# Altium schematic symbol library AA_Symbols.SchLib: 1017 symbols (part 1 of 7) (continued)
## Cap_Ceramic_10u_50V_1210_10%
designator C?, comment DIELECTRIC: X7S  Voltage: 50V  (hidden comment: 10uF)
Capacitor, Ceramic, X7S, 10 uF, 50V, 1210, 10%; Manufacturer: Murata Electronics; Manufacturer P/N: GCM32EC71H106KA03K; Outset P/N: PN-0008382; Tolerance: 10%; Value: 10uF
footprint CC_3225_1210_N (Chip Capacitor, 2-Leads, Body 3.2x2.5mm, IPC Medium Density)
pins: 1, 2

## Cap_Ceramic_10u_50V_1210_10%_1
designator C?, comment DIELECTRIC: X7S  Voltage: 50V  (hidden comment: 10uF)
Capacitor, Ceramic, X7S, 10 uF, 50V, 1210, 10%; Manufacturer: Murata Electronics; Manufacturer P/N: GCM32EC71H106KA03K; Tolerance: 10%; Value: 10uF
footprint CC_3225_1210_N (Chip Capacitor, 2-Leads, Body 3.2x2.5mm, IPC Medium Density)
pins: 1, 2

## Cap_Ceramic_10u_50V_X7R_2220_20%
designator C?, comment DIELECTRIC: X7R  Voltage: 50V  (hidden comment: 10u)
Capacitor, Ceramic, 10u, 50V, X7R, 2220, 20%; Manufacturer: TDK Corporation; Manufacturer P/N: C5750X7R1H106M230KB; Outset P/N: PN-0003774; Supplier 1: Newark; Supplier Part Number 1: 87R4684; Value: 10u
footprint CC_5650_2220_N (Chip Capacitor, 2-Leads, Body 5.6x5.0mm, IPC Medium Density)
pins: 1, 2

## Cap_Ceramic_10u_100V_2220_20%
designator C?, comment DIELECTRIC: X7S  Voltage: 100V  (hidden comment: 10u)
Capacitor, Ceramic, 10u, 100V, X7S, 2220, 20%; Manufacturer: TDK Corporation; Manufacturer P/N: C5750X7S2A106M230KB; Outset P/N: PN-0001612; Value: 10u
footprint CC_5650_2220_N (Chip Capacitor, 2-Leads, Body 5.6x5.0mm, IPC Medium Density)
pins: 1, 2

## Cap_Ceramic_10uF_10V_0402_20%
designator C?, comment VOLTAGE: 10V  (hidden comment: 10uF)
Capacitor, Ceramic, 10uF, 10V, 0402, 20%, X5R; Manufacturer P/N: CL05A106MP5NUNC; Manufacturer: Samsung; Outset P/N: PN-0007044; TOLERANCE: 20%; TEMPERATURE: -55C ~ 85C; DIELECTRIC: X5R; VALUE: 10uF
footprint CC_1005_0402_L
pins: 1, 2

## Cap_Ceramic_10uF_16V_0805_10%_125*C
designator C?, comment 10uF
Capacitor, Ceramic, 10uF, 16V, 0805, 10%, X7R, 125*C; Manufacturer: Samsung; Manufacturer P/N: CL21B106KOQNNNE; Outset P/N: PN-0002067; Value: 10uF
footprint 0805
pins: 1, 2

## Cap_Ceramic_10uF_25V_0805
designator C?, comment VOLTAGE: 25V  (hidden comment: 10uF)
Capacitor, Ceramic, 10uF, 25V, 0805, 10%, X5R; Manufacturer: Samsung; Manufacturer P/N: CL21A106KAYNNNG; Outset P/N: PN-0007127; TOLERANCE: 10%; TEMPERATURE: -55°C ~ 85°C; DIELECTRIC: X5R; VALUE: 10uF
footprint CC_2012_0805_N (Chip Capacitor, 2-Leads, Body 2.0x1.3mm, IPC Medium Density)
footprint CC_2012_0805_L (Capacitor,non-polarized,Chip;2.00mm L X 1.25mm W X 0.14mm H)
pins: 1, 2

## Cap_Ceramic_10uF_25V_0805_10%
designator C?, comment VOLTAGE: 25V  (hidden comment: 10uF)
Capacitor, Ceramic, 10uF, 25V, 0805, 10%, X5R; Manufacturer P/N: CL21A106KAYNNNG; Manufacturer: Samsung; Outset P/N: PN-0007051; TOLERANCE: 10%; TEMPERATURE: -55°C ~ 85°C; DIELECTRIC: X5R; VALUE: 10uF
footprint CC_2012_0805_N
footprint CC_2012_0805_L
pins: 1, 2

## Cap_Ceramic_10uF_50V_1206
designator C?, comment VOLTAGE: 50V  (hidden comment: 10uF)
Capacitor, Ceramic, 10uF, 50V, 1206, 10%, X7R; Manufacturer: Samsung; Manufacturer P/N: CL31B106KBHNNNE; Outset P/N: PN-0007128; TEMPERATURE: -55C ~ 125C; TOLERANCE: 10%; DIELECTRIC: X7R; VALUE: 10uF
footprint CC_3216_1206_N (Chip Capacitor, 2-Leads, Body 3.2x1.6mm, IPC Medium Density)
footprint CC_3216_1206_L (Capacitor,non-polarized,Chip;3.20mm L X 1.60mm W X 1.70mm H)
pins: 1, 2

## Cap_Ceramic_10uF_50V_1206_1
designator C?, comment DIELECTRIC: X7R  VOLTAGE: 50V  (hidden comment: 10uF)
Capacitor, Ceramic, 10uF, 50V, 1206, 10%, X7R; Manufacturer P/N: CL31B106KBHNNNE; Manufacturer: Samsung Electro-Mechanics; Outset P/N: PN-0007215; TOLERANCE: 10%; TEMPERATURE: -55C ~ 125C; VALUE: 10uF
footprint CC_3216_1206_N
footprint CC_3216_1206_L
pins: 1, 2

## Cap_Ceramic_10uF_50V_1206_10%
designator C?, comment VOLTAGE: 50V  (hidden comment: 10uF)
Capacitor, Ceramic, 10uF, 50V, 1206, 10%, X7R; Manufacturer: Samsung; Manufacturer P/N: CL31B106KBHNNNE; Outset P/N: PN-0007053; TOLERANCE: 10%; TEMPERATURE: -55C ~ 125C; DIELECTRIC: X7R; VALUE: 10uF
footprint CC_3216_1206_N
footprint CC_3216_1206_L
pins: 1, 2

## Cap_Ceramic_10uF_50V_1210_10%
designator C?, comment Voltage: 50V  DIELECTRIC: X5R  (hidden comment: 10uF)
Capacitor, Ceramic, 10uF, 50V, X5R, 1210, 10%; Manufacturer: TDK Corporation; Manufacturer P/N: C3225X5R1H106K250AB; Outset P/N: PN-0008402; Value: 10uF
footprint CC_3225_1210_N
pins: 1, 2

## Cap_Ceramic_12p_50V_0603_5%
designator C?, comment Voltage: 50V  DIELECTRIC: NP0  (hidden comment: 12p, 5%)
Capacitor, Ceramic, 12p, 50V, 0603, 5%; Manufacturer: TDK Corporation; Manufacturer P/N: C1608C0G1H120J; Outset P/N: 0000022; Value: 12p, 5%
footprint CC_1608_0603_N
pins: 1, 2

## Cap_Ceramic_18p_50V_0603_5%
designator C?, comment DIELECTRIC: NP0  Voltage: 50V  (hidden comment: 18p, 5%)
Capacitor, Ceramic, NP0, 18p, 50V, 0603, 5%; Manufacturer: TDK; Manufacturer P/N: CGA3E2C0G1H180J080AA; Outset P/N: PN-0002770; Value: 18p, 5%
footprint CC_1608_0603_N (Chip Capacitor, 2-Leads, Body 1.6x0.8mm, IPC Medium Density)
pins: 1, 2

## Cap_Ceramic_22nF_50V_0402_10%
designator C?, comment VOLTAGE: 50V  (hidden comment: 22nF)
Capacitor, Ceramic, 22nF, 50V, 0402, 10%, X7R; Manufacturer P/N: CC0402KRX7R9BB223; Manufacturer: Yageo; Outset P/N: PN-0007041; TOLERANCE: 10%; TEMPERATURE: -55C ~ 125C; DIELECTRIC: X7R; VALUE: 22nF
footprint CC_1005_0402_L
pins: 1, 2

## Cap_Ceramic_22p_50V_0402_5%
designator C?, comment 22pF
Capacitor, Ceramic, 22pF, 5%, 50V C0G/NPO 0402; Manufacturer: Yageo; Manufacturer P/N: CC0402JRNPO9BN220; Outset P/N: PN-0005556; Value: 22pF
footprint CC_1005_0402_N (Chip Capacitor, 2-Leads, Body 1.0x0.5mm, IPC Medium Density)
pins: 1, 2

## Cap_Ceramic_22p_50V_0603_5%
designator C?, comment Voltage: 50V  DIELECTRIC: NP0  (hidden comment: 22p, 5%)
Capacitor, Ceramic, 22p, 50V, 0603, 5%; Manufacturer: TDK Corporation; Manufacturer P/N: C1608C0G1H220J; Outset P/N: 0000026; Value: 22p, 5%
footprint CC_1608_0603_N (Chip Capacitor, 2-Leads, Body 1.6x0.8mm, IPC Medium Density)
pins: 1, 2

## Cap_Ceramic_22pF_50V_0402_5%
designator C?, comment DIELECTRIC: C0G  VOLTAGE: 50V  (hidden comment: 22pF)
Capacitor, Ceramic, 22pF, 50V, 0402, 5%, C0G; Manufacturer P/N: CC0402JRNPO9BN220; Manufacturer: Yageo; Outset P/N: PN-0007037; TOLERANCE: 5%; TEMPERATURE: -55C ~ 125C; VALUE: 22pF
footprint CC_1005_0402_L
pins: 1, 2

## Cap_Ceramic_22uF_16V_0805_20%
designator C?, comment VOLTAGE: 16V  (hidden comment: 22uF)
Capacitor, Ceramic, 22uF, 16V, 0805, 20%, X5R; Manufacturer P/N: CL21A226MOQNNNE; Manufacturer: Samsung; Outset P/N: PN-0007052; TOLERANCE: 20%; TEMPERATURE: -55°C ~ 85°C; DIELECTRIC: X5R; VALUE: 22uF
footprint CC_2012_0805_N
footprint CC_2012_0805_L
pins: 1, 2

## Cap_Ceramic_27nF_25V_0402_10%
designator C?, comment VOLTAGE: 25V  (hidden comment: 27nF)
Capacitor, Ceramic, 27nF, 25V, 0402, 10%, X7R; Manufacturer P/N: CC0402KRX7R8BB273; Manufacturer: Yageo; Outset P/N: PN-0007043; TOLERANCE: 10%; TEMPERATURE: -55C ~ 125C; DIELECTRIC: X7R; VALUE: 27nF
footprint CC_1005_0402_L
pins: 1, 2

## Cap_Ceramic_30p_50V_0603_5%
designator C?, comment DIELECTRIC: NP0  Voltage: 50V  (hidden comment: 30p, 5%)
Capacitor, Ceramic, NP0, 30p, 50V, 0603, 5%; Manufacturer: AVX Corporation; Manufacturer P/N: 06035A300JAT2A; Outset P/N: PN-0001736; Value: 30p, 5%
footprint CC_1608_0603_N (Chip Capacitor, 2-Leads, Body 1.6x0.8mm, IPC Medium Density)
pins: 1, 2

## Cap_Ceramic_30pF_50V_0402_2%
designator C?, comment VOLTAGE: 50V  (hidden comment: 30pF)
Capacitor, Ceramic, 30pF, 50V, 0402, 2%, C0G; Manufacturer P/N: CC0402GRNPO9BN300; Manufacturer: Yageo; Outset P/N: PN-0007034; DIELECTRIC: C0G; TEMPERATURE: -55C ~ 125C; TOLERANCE: 2%; VALUE: 30pF
footprint CC_1005_0402_L
pins: 1, 2

## Cap_Ceramic_39nF_16V_0402_10%
designator C?, comment DIELECTRIC: X7R  VOLTAGE: 16V  (hidden comment: 39nF)
Capacitor, Ceramic, 39nF, 16V, 0402, 10%, X7R; Manufacturer P/N: C0402C393K4RAC7867; Manufacturer: Kemet; Outset P/N: PN-0008339; TOLERANCE: 10%; TEMPERATURE: -55C ~ 125C; VALUE: 39nF
footprint CC_1005_0402_L
pins: 1, 2

## Cap_Ceramic_39p_50V_0603_5%
designator C?, comment Voltage: 50V  DIELECTRIC: NP0  (hidden comment: 39p)
Capacitor, Ceramic, 39p, 50V, 0603, 5%; Manufacturer: TDK Corporation; Manufacturer P/N: C1608C0G1H390J; Outset P/N: 0000027; Value: 39p
footprint CC_1608_0603_N
pins: 1, 2

## Cap_Ceramic_39pF_50V_0402_5%
designator C?, comment DIELECTRIC: C0G  VOLTAGE: 50V  (hidden comment: 39pF)
Capacitor, Ceramic, 39pF, 50V, 0402, 5%, C0G; Manufacturer P/N: CC0402JRNPO9BN390; Manufacturer: Yageo; Outset P/N: PN-0007038; TOLERANCE: 5%; TEMPERATURE: -55C ~ 125C; VALUE: 39pF
footprint CC_1005_0402_L
pins: 1, 2

## Cap_Ceramic_39pf_50V_0603_10%
designator C?, comment DIELECTRIC: NP0  Voltage: 50V  (hidden comment: 39pF)
Capacitor, Ceramic, NP0, 39pF, 50V, 0603, 10%; Manufacturer: Kemet; Manufacturer P/N: C0603C390K5GACTU; Outset P/N: PN-0001773; Value: 39pF
footprint CC_1608_0603_N (Chip Capacitor, 2-Leads, Body 1.6x0.8mm, IPC Medium Density)
pins: 1, 2

## Cap_Ceramic_47pF_25V_0402_5%_C0G/NP0
designator C?, comment 47pF
Cap_Ceramic_47pF_25V_0402_5%_C0G/NP0; Manufacturer: Kemet; Manufacturer P/N: C0402C470J3GACTU; Outset P/N: PN-0005391; Value: 47pF
footprint CC_1005_0402_N (Chip Capacitor, 2-Leads, Body 1.0x0.5mm, IPC Medium Density)
pins: 1, 2

## Cap_Ceramic_47u_16V_1210_20%
designator C?, comment DIELECTRIC: X6S  Voltage: 16V  (hidden comment: 47uF)
Capacitor, Ceramic, X6S, 47uF, 16V, 1210, 20%; Manufacturer: Murata Electronics; Manufacturer P/N: GRM32EC81C476ME15L; Outset P/N: PN-0008383; Tolerance: 20%; Value: 47uF
footprint CC_3225_1210_N (Chip Capacitor, 2-Leads, Body 3.2x2.5mm, IPC Medium Density)
pins: 1, 2

## Cap_Ceramic_47uF_6.3V_1210_20%
designator C?, comment Voltage: 6.3V  DIELECTRIC: X5R  (hidden comment: 47uF)
Capacitor, Ceramic, 47uF, 6.3V, 1210, 20%; Manufacturer: TDK Corporation; Manufacturer P/N: C3225X5R0J476M250AA; Outset P/N: PN-0003750; Value: 47uF
footprint CC_3225_1210_N
pins: 1, 2

## Cap_Ceramic_100nF_10V_0402_10%
designator C?, comment DIELECTRIC: X7R  VOLTAGE: 10V  (hidden comment: 100nF)
Capacitor, Ceramic, 100nF, 10V, 0402, 10%, X7R; Manufacturer P/N: C0402C104K8RAC7867; Manufacturer: Kemet; Outset P/N: PN-0008331; TOLERANCE: 10%; TEMPERATURE: -55C ~ 125C; VALUE: 100nF
footprint CC_1005_0402_L
pins: 1, 2

## Cap_Ceramic_100nF_50V_0402_10%
designator C?, comment DIELECTRIC: X7R  VOLTAGE: 50V  (hidden comment: 100nF)
Capacitor, Ceramic, 100nF, 50V, 0402, 10%, X7R; Manufacturer P/N: CC0402KRX7R9BB104; Manufacturer: Yageo; Outset P/N: PN-0007039; TOLERANCE: 10%; TEMPERATURE: -55C ~ 125C; VALUE: 100nF
footprint CC_1005_0402_L
pins: 1, 2

## Cap_Ceramic_100pF_25V_0402_10%
designator C?, comment DIELECTRIC: X7R  VOLTAGE: 25V  (hidden comment: 100pF)
Capacitor, Ceramic, 100pF, 25V, 0402, 10%, X7R; Manufacturer P/N: C0402C101K3RAC7867; Manufacturer: Kemet; Outset P/N: PN-0008328; TOLERANCE: 10%; TEMPERATURE: -55C ~ 125C; VALUE: 100pF
footprint CC_1005_0402_L
pins: 1, 2

## Cap_Ceramic_100pF_50V_0402
designator C?, comment DIELECTRIC: C0G/NPO  VOLTAGE: 50V  (hidden comment: 100pF)
Capacitor, Ceramic, 100pF, 50V, 0402, 10%, C0G/NPO; Manufacturer: Yageo; Manufacturer P/N: CC0402KRNPO9BN101; Outset P/N: PN-0007125; TOLERANCE: 10%; TEMPERATURE: -55C ~ 125C; VALUE: 100pF
footprint CC_1005_0402_L
pins: 1, 2

## Cap_Ceramic_100pF_50V_0402_2%
designator C?, comment DIELECTRIC: C0G  VOLTAGE: 50V  (hidden comment: 100pF)
Capacitor, Ceramic, 100pF, 50V, 0402, 2%, C0G; Manufacturer P/N: CC0402GRNPO9BN101; Manufacturer: Yageo; Outset P/N: PN-0007033; TOLERANCE: 2%; TEMPERATURE: -55C ~ 125C; VALUE: 100pF
footprint CC_1005_0402_L
pins: 1, 2

## Cap_Ceramic_100pF_50V_0603_5%
designator C?, comment DIELECTRIC: NP0  Voltage: 50V  (hidden comment: 100p)
Capacitor, Ceramic, NP0, 100p, 50V, 0603, 5%; Manufacturer: Murata; Manufacturer P/N: GRM1885C1H101JA01D; Outset P/N: PN-0001679; Value: 100p
footprint CC_1608_0603_N (Chip Capacitor, 2-Leads, Body 1.6x0.8mm, IPC Medium Density)
pins: 1, 2

## Cap_Ceramic_100u_10V_1206_20%
designator C?, comment Voltage: 10V  DIELECTRIC: X5R  (hidden comment: 100u, 20%)
Capacitor, Ceramic, 100u, 10V, 1206, 20%; Manufacturer: TDK Corporation; Manufacturer P/N: C3216X5R1A107M; Outset P/N: 0000016; Value: 100u, 20%
footprint CC_3216_1206_N (Chip Capacitor, 2-Leads, Body 3.2x1.6mm, IPC Medium Density)
pins: 1, 2

## Cap_Ceramic_100u_16V_1210_20%
designator C?, comment DIELECTRIC: X5R  Voltage: 16V  (hidden comment: 100u, 20%)
Capacitor, Ceramic, 100u, 16V, 1210, 20%; Manufacturer: Taiyo Yuden; Manufacturer P/N: EMK325ABJ107MM-T; Outset P/N: 0000017; Value: 100u, 20%
footprint CC_3225_1210_N
pins: 1, 2

## Cap_Ceramic_100uF_6.3V_1812_20%
designator C?, comment Voltage: 6.3V  DIELECTRIC: X5R  (hidden comment: 100uF)
Capacitor, Ceramic, 100uF, 6.3V, 1812, 20%; Manufacturer: TDK Corporation; Manufacturer P/N: C4532X5R0J107M280KA; Outset P/N: PN-0003757; Value: 100uF
footprint CC_4532_1812_N (Chip Capacitor, 2-Leads, Body 4.5x3.2mm, IPC Medium Density)
pins: 1, 2

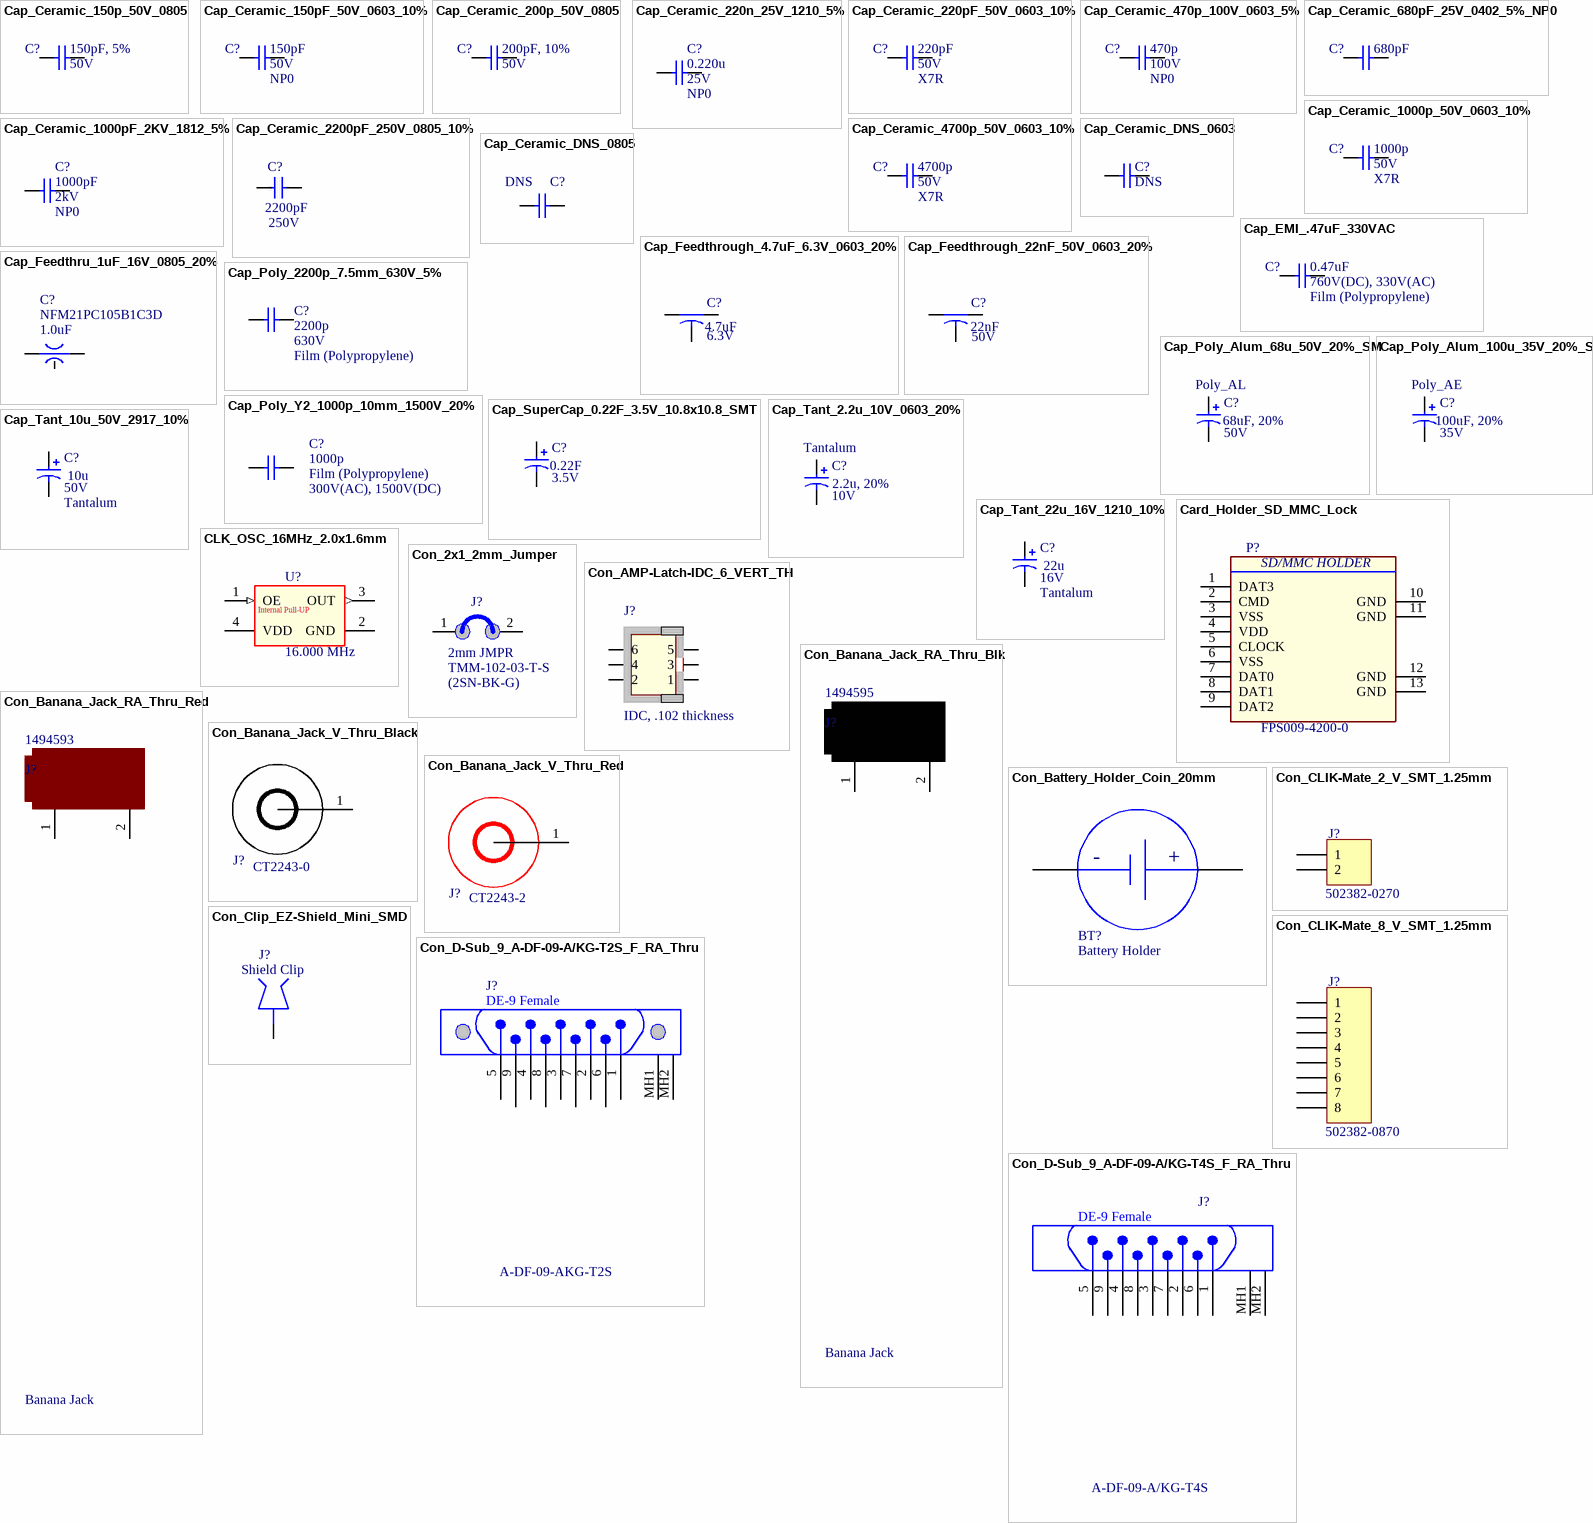
[diagram p3: symbols Cap_Ceramic_150p_50V_0805 to Con_D-Sub_9_A-DF-09-A/KG-T4S_F_RA_Thru]

## Cap_Ceramic_150p_50V_0805
designator C?, comment Voltage: 50V  (hidden comment: 150pF, 5%)
CAP CER 150pF 50V C0G/NP0 0805; Manufacturer: Samsung Electro-Mechanics; Manufacturer P/N: CL21C151JBANNNC; Outset P/N: PN-0003755; Value: 150pF, 5%
footprint CC_2012_0805_N (Chip Capacitor, 2-Leads, Body 2.0x1.3mm, IPC Medium Density)
pins: 1, 2

## Cap_Ceramic_150pF_50V_0603_10%
designator C?, comment Voltage: 50V  DIELECTRIC: NP0  (hidden comment: 150pF)
Capacitor, Ceramic, 150pF, 50V, 0603, 10%; Manufacturer: Kemet; Manufacturer P/N: C0603C151K5GACTU; Outset P/N: 0000023; Value: 150pF
footprint CC_1608_0603_N
pins: 1, 2

## Cap_Ceramic_200p_50V_0805
designator C?, comment Voltage: 50V  (hidden comment: 200pF, 10%)
CAP CER 200pF 50V C0G/NP0 0805; Manufacturer: Samsung Electro-Mechanics; Manufacturer P/N: CL21B201KBANNNC; Outset P/N: PN-0003760; Value: 200pF, 10%
footprint CC_2012_0805_N (Chip Capacitor, 2-Leads, Body 2.0x1.3mm, IPC Medium Density)
pins: 1, 2

## Cap_Ceramic_220n_25V_1210_5%
designator C?, comment DIELECTRIC: NP0  Voltage: 25V  (hidden comment: 0.220u)
Capacitor, Ceramic, NP0, 0.220u, 25V, 1210, 5%; Manufacturer: Kemet; Manufacturer P/N: C1210C224J3GACTU; Outset P/N: PN-0001694; Value: 0.220u
footprint CC_3225_1210_N (Chip Capacitor, 2-Leads, Body 3.2x2.5mm, IPC Medium Density)
pins: 1, 2

## Cap_Ceramic_220pF_50V_0603_10%
designator C?, comment Voltage: 50V  DIELECTRIC: X7R  (hidden comment: 220pF)
Capacitor, Ceramic, 220pF, 50V, 0603, 10%; Manufacturer: Kemet; Manufacturer P/N: C0603C221K5RACTU; Outset P/N: 0000025; Value: 220pF
footprint CC_1608_0603_N
pins: 1, 2

## Cap_Ceramic_470p_100V_0603_5%
designator C?, comment DIELECTRIC: NP0  Voltage: 100V  (hidden comment: 470p)
Capacitor, Ceramic, NP0, 470p, 100V, 0603, 5%; Manufacturer: Murata; Manufacturer P/N: GCM1885C2A471JA16D; Outset P/N: PN-0001720; Value: 470p
footprint CC_1608_0603_N (Chip Capacitor, 2-Leads, Body 1.6x0.8mm, IPC Medium Density)
pins: 1, 2

## Cap_Ceramic_680pF_25V_0402_5%_NP0
designator C?, comment 680pF
Cap_Ceramic_680pF_25V_0402_5%_NP0; Manufacturer: Kemet; Manufacturer P/N: C0402C681J3GAC7867; Outset P/N: PN-0005392; Value: 680pF
footprint CC_1005_0402_N (Chip Capacitor, 2-Leads, Body 1.0x0.5mm, IPC Medium Density)
footprint 0402 (Paramit's recommendation)
pins: 1, 2

## Cap_Ceramic_1000p_50V_0603_10%
designator C?, comment Voltage: 50V  DIELECTRIC: X7R  (hidden comment: 1000p)
Capacitor, Ceramic, 1000p, 50V, 0603, 10%; Manufacturer: Kemet; Manufacturer P/N: C0603C102K5RACTU; Outset P/N: 0000015; Value: 1000p
footprint CC_1608_0603_N
pins: 1, 2

## Cap_Ceramic_1000pF_2KV_1812_5%
designator C?, comment DIELECTRIC: NP0  Voltage: 2kV  (hidden comment: 1000pF)
Capacitor, Ceramic, NP0, 1000pF, 2kV, 1812, 5%; Manufacturer: Kemet; Manufacturer P/N: C1812C102JGGACTU; Outset P/N: PN-0001733; Value: 1000pF
footprint CC_3225_1210_N (Chip Capacitor, 2-Leads, Body 3.2x2.5mm, IPC Medium Density)
footprint CC_4532_1812_N (Chip Capacitor, 2-Leads, Body 4.5x3.2mm, IPC Medium Density)
pins: 1, 2

## Cap_Ceramic_2200pF_250V_0805_10%
designator C?, comment VOLTAGE: 250V  (hidden comment: 2200pF)
Capacitor, Ceramic, 2200pF, 250V, 0805, 10%, X7R; Manufacturer: Murata Electronics; Manufacturer P/N: GRM21AR72E222KW01D; Outset P/N: PN-0008173; TOLERANCE: 10%; TEMPERATURE: -55°C ~ 125°C; DIELECTRIC: X7R; VALUE: 2200pF
footprint CC_2012_0805_N (Chip Capacitor, 2-Leads, Body 2.0x1.3mm, IPC Medium Density)
footprint CC_2012_0805_L (Capacitor,non-polarized,Chip;2.00mm L X 1.25mm W X 0.14mm H)
pins: 1, 2

## Cap_Ceramic_4700p_50V_0603_10%
designator C?, comment Voltage: 50V  DIELECTRIC: X7R  (hidden comment: 4700p)
Capacitor, Ceramic, 4700p, 50V, 0603, 10%; Manufacturer: TDK Corporation; Manufacturer P/N: C1608X7R1H472K080AE; Outset P/N: 0000029; Value: 4700p
footprint CC_1608_0603_N
pins: 1, 2

## Cap_Ceramic_DNS_0603
designator C?, comment DNS
Capacitor, Ceramic, DNS, 0603; Outset P/N: 0000030; Manufacturer: N/A; Manufacturer P/N: N/A; Voltage: *; DIELECTRIC: N/A; Value: DNS; NOSTUFF: DNS
footprint CC_1608_0603_N
pins: 1, 2

## Cap_Ceramic_DNS_0805
designator C?, comment DNS
Capacitor, Ceramic, DNS, 0805; Outset P/N: PN-0002791; Manufacturer: N/A; Manufacturer P/N: N/A; Value: DNS; DIELECTRIC: N/A; Voltage: *; NOSTUFF: DNS
footprint CC_2012_0805_N (Chip Capacitor, 2-Leads, Body 2.0x1.3mm, IPC Medium Density)
pins: 1, 2

## Cap_EMI_.47uF_330VAC
designator C?, comment DIELECTRIC: Film (Polypropylene)  Voltage: 760V(DC), 330V(AC)  (hidden comment: 0.47uF)
Capacitor, Film, 0.47uF, 330VAC, 760VDC; Manufacturer: EPCOS Inc.; Manufacturer P/N: B32913A3474M; Outset P/N: 0000031; Value: 0.47uF
footprint Cap_EMI_B32913
pins: 1, 2

## Cap_Feedthrough_4.7uF_6.3V_0603_20%
designator C?, comment Voltage: 6.3V  (hidden comment: 4.7uF)
Cap_Feedthrough, 4.7uF_6.3V_0603_Power_20%; Manufacturer: TDK; Manufacturer P/N: YFF18PW0J475MT0H0N; Outset P/N: PN-0005732; Value: 4.7uF
footprint 0603 - Feedthrough, Power
pins: 1 IN, 2 OUT, 3 GND

## Cap_Feedthrough_22nF_50V_0603_20%
designator C?, comment Voltage: 50V  (hidden comment: 22nF)
Capacitor, Feedthrough, 22nF, 50V, Signal, 20%; Manufacturer: TDK; Manufacturer P/N: YFF18SC1H223MT0H0N; Outset P/N: PN-0005731; Value: 22nF
footprint 0603 - Feedthrough, Signal
pins: 1 IN, 2 OUT, 3 GND

## Cap_Feedthru_1uF_16V_0805_20%
designator C?, comment Manufacturer P/N: NFM21PC105B1C3D  (hidden comment: 1.0uF)
Capacitor, Feedthrough, 1uF, 20%, 16V, 0805; Manufacturer: Murata; Outset P/N: PN-0008341; VOLTAGE: 16V; TOLERANCE: 20%; TEMPERATURE: -40°C ~ 85°C; VALUE: 1.0uF
footprint CC_2012_0805_3-PAD
pins: 1, 2, 3

## Cap_Poly_2200p_7.5mm_630V_5%
designator C?, comment DIELECTRIC: Film (Polypropylene)  Voltage: 630V  (hidden comment: 2200p)
Capacitor, Polypropylene, 2200p, 7.5mm leads, 630V, 5%; Manufacturer: WIMA; Manufacturer P/N: MKP1J012202C00JSSD; Outset P/N: 0000032; Value: 2200p
footprint MKP1_4x10 (4mm x 10mm capacitor)
pins: 1, 2

## Cap_Poly_Alum_68u_50V_20%_SM
designator C?, comment DIELECTRIC: Poly_AL  Voltage: 50V  (hidden comment: 68uF, 20%)
CAP POLYMER-ALUM HYB 68UF 20% 50V SMD; Manufacturer: Panasonic; Manufacturer P/N: EEH-ZA1H680P; Outset P/N: PN-0008167; Value: 68uF, 20%
footprint CAPAE830X1050N (Capacitor,Aluminum Electrolytic;8.30mm L X 8.30mm W X 10.50mm H)
pins: 1 POS, 2 NEG

## Cap_Poly_Alum_100u_35V_20%_SM
designator C?, comment DIELECTRIC: Poly_AE  Voltage: 35V  (hidden comment: 100uF, 20%)
Capacitor, Polymer-Aluminum, 100UF 20% 35V SMD; Manufacturer: Panasonic; Manufacturer P/N: EEH-ZK1V101XP; Outset P/N: PN-0008168; Value: 100uF, 20%
footprint CAPAE660X800L260X65N (Capacitor, Aluminum Electrolytic; 6.60 mm L X 6.60 mm W X 8.00 mm H body)
pins: 1 POS, 2 NEG

## Cap_Poly_Y2_1000p_10mm_1500V_20%
designator C?, comment DIELECTRIC: Film (Polypropylene)  Voltage: 300V(AC), 1500V(DC)  (hidden comment: 1000p)
Capacitor, Polypropylene, Y2 Class, 1000p, 10.5mm leads, 1500VDC, 20%; Manufacturer: EPCOS; Manufacturer P/N: B32021A3102M; Outset P/N: 0000033; Value: 1000p
footprint MKP1_4x13 (4mm x 13mm capacitor)
pins: 1, 2

## Cap_SuperCap_0.22F_3.5V_10.8x10.8_SMT
designator C?, comment Voltage: 3.5V  (hidden comment: 0.22F)
Capacitor, Supercapacitor, 0.22F, 3.5V, 10.8x10.8mm, SMT; Manufacturer: KEMET; Manufacturer P/N: FC0V224ZFTBR24; Outset P/N: PN-0004202; Value: 0.22F
footprint CAP_POL_10.8X10.8MM_SMT (Capacitor, SuperCap, 10.8 mm L X 10.8mm W X 16.00 mm H body)
pins: 1 POS, 2 NEG

## Cap_Tant_2.2u_10V_0603_20%
designator C?, comment Voltage: 10V  DIELECTRIC: Tantalum  (hidden comment: 2.2u, 20%)
Capacitor, Tantalum, 2.2u, 10V, 0603, 20%; Manufacturer: Nichicon; Manufacturer P/N: F981A225MMA; Outset P/N: 0000035; Value: 2.2u, 20%
footprint 0603_POLCAP
pins: 1 POS, 2 NEG

## Cap_Tant_10u_50V_2917_10%
designator C?, comment DIELECTRIC: Tantalum  Voltage: 50V  (hidden comment: 10u)
Capacitor, Tantalum, 10u, 50V, 2917, 10%; Manufacturer: AVX Corporation; Manufacturer P/N: TAJD106K050RNJ; Outset P/N: 0000034; Value: 10u
footprint 7343
pins: 1 POS, 2 NEG

## Cap_Tant_22u_16V_1210_10%
designator C?, comment DIELECTRIC: Tantalum  Voltage: 16V  (hidden comment: 22u)
Capacitor, Tantalum, 22u, 16V, 1210, 10%; Manufacturer: AVX Corporation; Manufacturer P/N: TAJB226K016RNJ; Outset P/N: 0000036; Value: 22u
footprint 3528_Polarized
pins: 1 POS, 2 NEG

## Card_Holder_SD_MMC_Lock
designator P?, comment FPS009-4200-0
SD Card and MMC Holder with lock; Manufacturer: Yamaichi; Outset P/N: PN-0001699; Manufacturer P/N: FPS009-4200-0; Value: FPS009-4200-0
footprint CONN_Yamaichi_FPS009-4200-0 (Yamaichi, SD Socket)
pins: 1 DAT3, 2 CMD, 3 VSS, 4 VDD, 5 CLOCK, 6 VSS, 7 DAT0, 8 DAT1, 9 DAT2, 10 GND, 11 GND, 12 GND, 13 GND
text: SD/MMC HOLDER

## CLK_OSC_16MHz_2.0x1.6mm
designator U?, comment 16.000 MHz
CLK OSC, HCMOS, 16MHz, 3.3V, 2.0x1.6mm; Manufacturer: Abracon; Manufacturer P/N: ASA-16.000MHZ-L-T; Outset P/N: PN-0002789; Value: 16.000 MHz
footprint OSC_2.0x1.6mm (Footprint not found)
pins: 1 OE (in), 2 GND (power), 3 OUT (out), 4 VDD (power)
text: Internal Pull-UP

## Con_2x1_2mm_Jumper
designator J?, comment 2mm JMPR  value TMM-102-03-T-S  Mating P/N: (2SN-BK-G)
2x1, 2mm Jumper; Manufacturer: Samtec; Outset P/N: PN-0002757; Manufacturer P/N: TMM-102-03-T-S
footprint CON_1x2_2mm_Jumper (1x2, 2mm, Jumper Shunt)
pins: 1, 2

## Con_AMP-Latch-IDC_6_VERT_TH
designator J?, comment IDC, .102 thickness
Connector, IDC 3x2, Vertical, .102 board thickness; Manufacturer: TE Connectivity; Manufacturer P/N: 2-1761608-1; Outset P/N: PN-0002156; Supplier 1: Digi-Key; Supplier Part Number 1: A101794-ND; Value: IDC, .102 thickness
footprint 2-1761608-1 (6 Positions Header, Shrouded Connector 0.100" (2.54mm) Through Hole Gold)
pins: 1, 2, 3, 4, 5, 6

## Con_Banana_Jack_RA_Thru_Blk
designator J?, comment Banana Jack  Supplier Part Number 1: 1494595
Connector, Banana Jack, RA, Thru, Black; Manufacturer: Deltron; Manufacturer P/N: 571-0100; Outset P/N: PN-0002462; Distributor: Mouser; Distributor P/N: 164-6218; Supplier 1: Farnell
footprint CON_BANANA_RA_BLK (Deltron Banana Jack 571-xxxx series)
pins: 1, 2

## Con_Banana_Jack_RA_Thru_Red
designator J?, comment Banana Jack  Supplier Part Number 1: 1494593
Connector, Banana Jack, RA, Thru, Red; Manufacturer: Deltron; Manufacturer P/N: 571-0500; Outset P/N: PN-0002463; Distributor: Mouser; Distributor P/N: 164-6219; Supplier 1: Farnell
footprint CON_BANANA_RA_RED (Deltron Banana Jack 571-xxxx series)
pins: 1, 2

## Con_Banana_Jack_V_Thru_Black
designator J?, comment CT2243-0
Connector, Banana Jack, Threaded, Black; Manufacturer: Cal Test Electronics; Outset P/N: PN-0007142; Manufacturer P/N: CT2243-0; Value: CT2243-0
footprint CT2243-0
pins: 1 VCC

## Con_Banana_Jack_V_Thru_Red
designator J?, comment CT2243-2
Connector, Banana Jack, Threaded, Red; Manufacturer: Cal Test Electronics; Outset P/N: PN-0007141; Manufacturer P/N: CT2243-2; Value: CT2243-2
footprint CT2243-2
pins: 1 VCC

## Con_Battery_Holder_Coin_20mm
designator BT?, comment Battery Holder
Connector, Battery Holder, Coin, 20mm, 1 Cell; Manufacturer: Keystone Electronics; Manufacturer P/N: 103; Outset P/N: 0000037
footprint 103_CR2025_HOLDER
pins: 1 + (power), 2 - (power)

## Con_CLIK-Mate_2_V_SMT_1.25mm
designator J?, comment 502382-0270
Connector, CLIK-Mate, 2 Position, Vert, SMT, 1.25mm; Manufacturer: Molex; Outset P/N: 0000038; Manufacturer P/N: 502382-0270
footprint 502382-0270 (Connector, CLIK-Mate, 2 Position, Vert, SMT, 1.25mm)
pins: 1, 2

## Con_CLIK-Mate_8_V_SMT_1.25mm
designator J?, comment 502382-0870
Connector, CLIK-Mate, 8 Position, Vert, SMT, 1.25mm; Manufacturer: Molex; Outset P/N: 0000039; Manufacturer P/N: 502382-0870
footprint 502382-0870 (Connector, CLIK-Mate, 8 Position, Vert, SMT, 1.25mm)
pins: 1, 2, 3, 4, 5, 6, 7, 8

## Con_Clip_EZ-Shield_Mini_SMD
designator J?, comment Shield Clip
Connector, Clip, EZ-Shield, Mini, SMT; Manufacturer: Harwin Inc; Manufacturer P/N: S0971-46R; Outset P/N: 0000040
footprint S0971-46R (Connector, Clip, EZ-Shield, Mini, SMT)
pins: 1

## Con_D-Sub_9_A-DF-09-A/KG-T2S_F_RA_Thru
designator J?, comment A-DF-09-AKG-T2S
Connector, D-Subminature, 9 Position, Female, Right Angle, Through Hole; Manufacturer: Assmann WSW Components; Outset P/N: PN-0001613; Manufacturer P/N: A-DF-09-AKG-T2S; Value: A-DF-09-AKG-T2S
footprint A-DF-09-A/KG-T2S_DSUB9pin
pins: 1, 2, 3, 4, 5, 6, 7, 8, 9, MH1, MH2
text: DE-9 Female

## Con_D-Sub_9_A-DF-09-A/KG-T4S_F_RA_Thru
designator J?, comment A-DF-09-A/KG-T4S
Connector, D-Subminature, 9 Position, A-DF-09-A/KG-T4S, Female, Right Angle, Through Hole; Manufacturer: Assmann WSW Components; Outset P/N: PN-0001614; Manufacturer P/N: A-DF-09-A/KG-T4S; Value: A-DF-09-A/KG-T4S
footprint A-DF-09-A/KG-T2S_DSUB9pin
pins: 1, 2, 3, 4, 5, 6, 7, 8, 9, MH1, MH2
text: DE-9 Female

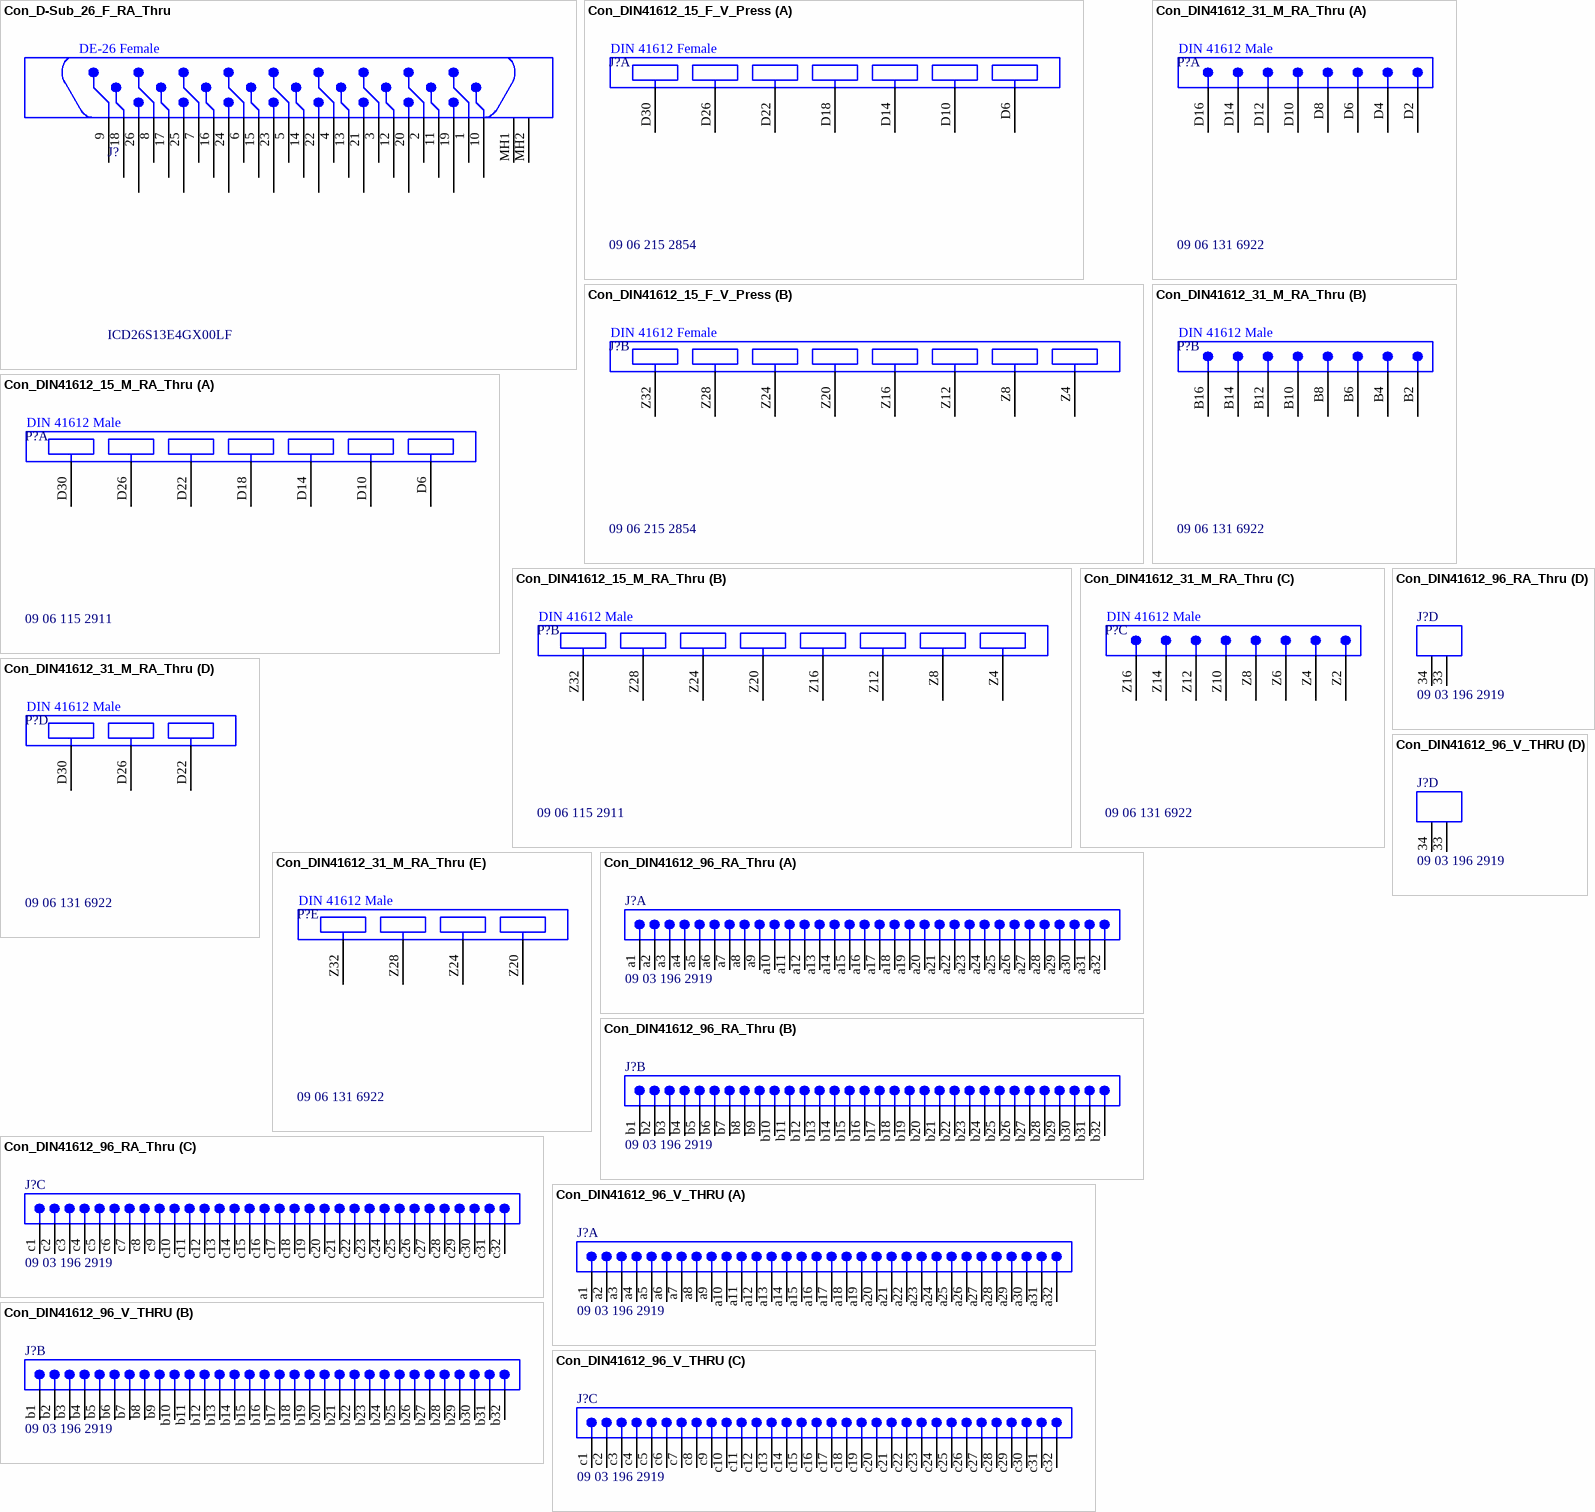
[diagram p4: symbols Con_D-Sub_26_F_RA_Thru to Con_DIN41612_96_V_THRU]

## Con_D-Sub_26_F_RA_Thru
designator J?, comment ICD26S13E4GX00LF
Connector, D-Subminature, 26 Position, Female, Right Angle, Through Hole; Manufacturer: Amphenol FCI; Outset P/N: PN-0001618; Manufacturer P/N: ICD26S13E4GX00LF; Value: ICD26S13E4GX00LF
footprint ICD26S13E4GX00LF_DSUB26pin (ICD26S13E4GX00LF, D-Sub 26, Through Hole)
pins: 1, 2, 3, 4, 5, 6, 7, 8, 9, 10, 11, 12, 13, 14, 15, 16, 17, 18, 19, 20, 21, 22, 23, 24, 25, 26, MH1, MH2
text: DE-26 Female

## Con_DIN41612_15_F_V_Press
designator J?, comment 09 06 215 2854
Connector, DIN 41612, 15 Blade, Female (Backplane Side), Vertical, Press Fit; Manufacturer: Harting; Outset P/N: PN-0001616; Manufacturer P/N: 09 06 215 2854; Value: 09 06 215 2854
footprint 09062152854/09 06 215 2856_DIN41612-15pin (09 06 215 2854 or 09 06 215 2856, Board-to-Board Connector, Eurocard VME, Vertical, 2-Row, Pitch 5.08mm, 15-Position)
part A pins: D6, D10, D14, D18, D22, D26, D30
part B pins: Z4, Z8, Z12, Z16, Z20, Z24, Z28, Z32
part A text: DIN 41612 Female
part B text: DIN 41612 Female

## Con_DIN41612_15_M_RA_Thru
designator P?, comment 09 06 115 2911
Connector, DIN 41612, 15 Blade, Male (Card Side), Right Angle, Through Hole; Manufacturer: Harting; Outset P/N: PN-0001617; Manufacturer P/N: 09 06 115 2911; Value: 09 06 115 2911
footprint 09061152911_DIN41612-15pin (09 06 115 2911, Board-to-Board Connector, Eurocard VME, Right Angle, 2-Row, Pitch 5.08mm, 15-Position)
part A pins: D6, D10, D14, D18, D22, D26, D30
part B pins: Z4, Z8, Z12, Z16, Z20, Z24, Z28, Z32
part A text: DIN 41612 Male
part B text: DIN 41612 Male